# Altium schematic symbol library jlcpcb_2025_04_capacitors_extended_0402.schlib: 3594 symbols (part 8 of 20) (continued)
## CC0402JRNPO9BN360
designator C?  Capacitance: 36pF  (hidden comment: *)
Capacitor, Ceramic (MLCC), 36pF, ±5%, 50V, NP0, ±5%, SMD 0402; Manufacturer: YAGEO; Manufacturer Part Number: CC0402JRNPO9BN360; Package Size: 0402; JLCPCB Basic Part: No; JLCPCB Part Number: C114394; Supplier 1: LCSC; Category: Capacitors - MLCC; Supplier Part Number 1: C114394; Tolerance: ±5%; Voltage Rating: 50V; Temperature Coefficient: NP0; RoHS: Yes; ComponentLink1Description: Datasheet; ComponentLink1URL: https://wmsc.lcsc.com/wmsc/upload/file/pdf/v2/lcsc/2304140030_YAGEO-CC0402JRNPO9BN360_C114394.pdf; ComponentLink2Description: JLCPCB Part URL; ComponentLink2URL: https://jlcpcb.com/partdetail/C114394; ComponentLink3Description: LCSC Part URL; ComponentLink3URL: https://lcsc.com/product-detail/Multilayer-Ceramic-Capacitors-MLCC---SMD-SMT_YAGEO-YAGEO-CC0402JRNPO9BN360_C114394.html
footprint CAP-0402 (0402 (1005M) Capacitor)
pins: 1, 2

## CC0402JRNPO9BN390
designator C?  Capacitance: 39pF  (hidden comment: *)
Capacitor, Ceramic (MLCC), 39pF, ±5%, 50V, NP0, ±5%, SMD 0402; Manufacturer: YAGEO; Manufacturer Part Number: CC0402JRNPO9BN390; Package Size: 0402; JLCPCB Basic Part: No; JLCPCB Part Number: C106223; Supplier 1: LCSC; Category: Capacitors - MLCC; Supplier Part Number 1: C106223; Tolerance: ±5%; Voltage Rating: 50V; Temperature Coefficient: NP0; RoHS: Yes; ComponentLink1Description: Datasheet; ComponentLink1URL: https://wmsc.lcsc.com/wmsc/upload/file/pdf/v2/lcsc/2304140030_YAGEO-CC0402JRNPO9BN390_C106223.pdf; ComponentLink2Description: JLCPCB Part URL; ComponentLink2URL: https://jlcpcb.com/partdetail/C106223; ComponentLink3Description: LCSC Part URL; ComponentLink3URL: https://lcsc.com/product-detail/Multilayer-Ceramic-Capacitors-MLCC---SMD-SMT_YAGEO-YAGEO-CC0402JRNPO9BN390_C106223.html
footprint CAP-0402 (0402 (1005M) Capacitor)
pins: 1, 2

## CC0402JRNPO9BN391
designator C?  Capacitance: 390pF  (hidden comment: *)
Capacitor, Ceramic (MLCC), 390pF, ±5%, 50V, NP0, ±5%, SMD 0402; Manufacturer: YAGEO; Manufacturer Part Number: CC0402JRNPO9BN391; Package Size: 0402; JLCPCB Basic Part: No; JLCPCB Part Number: C282239; Supplier 1: LCSC; Category: Capacitors - MLCC; Supplier Part Number 1: C282239; Tolerance: ±5%; Voltage Rating: 50V; Temperature Coefficient: NP0; RoHS: Yes; ComponentLink1Description: Datasheet; ComponentLink1URL: https://wmsc.lcsc.com/wmsc/upload/file/pdf/v2/lcsc/2304140030_YAGEO-CC0402JRNPO9BN391_C282239.pdf; ComponentLink2Description: JLCPCB Part URL; ComponentLink2URL: https://jlcpcb.com/partdetail/C282239; ComponentLink3Description: LCSC Part URL; ComponentLink3URL: https://lcsc.com/product-detail/Multilayer-Ceramic-Capacitors-MLCC---SMD-SMT_YAGEO-YAGEO-CC0402JRNPO9BN391_C282239.html
footprint CAP-0402 (0402 (1005M) Capacitor)
pins: 1, 2

## CC0402JRNPO9BN430
designator C?  Capacitance: 43pF  (hidden comment: *)
Capacitor, Ceramic (MLCC), 43pF, ±5%, 50V, NP0, ±5%, SMD 0402; Manufacturer: YAGEO; Manufacturer Part Number: CC0402JRNPO9BN430; Package Size: 0402; JLCPCB Basic Part: No; JLCPCB Part Number: C541364; Supplier 1: LCSC; Category: Capacitors - MLCC; Supplier Part Number 1: C541364; Tolerance: ±5%; Voltage Rating: 50V; Temperature Coefficient: NP0; RoHS: Yes; ComponentLink1Description: Datasheet; ComponentLink1URL: https://wmsc.lcsc.com/wmsc/upload/file/pdf/v2/lcsc/2006151112_YAGEO-CC0402JRNPO9BN430_C541364.pdf; ComponentLink2Description: JLCPCB Part URL; ComponentLink2URL: https://jlcpcb.com/partdetail/C541364; ComponentLink3Description: LCSC Part URL; ComponentLink3URL: https://lcsc.com/product-detail/Multilayer-Ceramic-Capacitors-MLCC---SMD-SMT_YAGEO-YAGEO-CC0402JRNPO9BN430_C541364.html
footprint CAP-0402 (0402 (1005M) Capacitor)
pins: 1, 2

## CC0402JRNPO9BN470
designator C?  Capacitance: 47pF  (hidden comment: *)
Capacitor, Ceramic (MLCC), 47pF, ±5%, 50V, NP0, ±5%, SMD 0402; Manufacturer: YAGEO; Manufacturer Part Number: CC0402JRNPO9BN470; Package Size: 0402; JLCPCB Basic Part: No; JLCPCB Part Number: C60137; Supplier 1: LCSC; Category: Capacitors - MLCC; Supplier Part Number 1: C60137; Tolerance: ±5%; Voltage Rating: 50V; Temperature Coefficient: NP0; RoHS: Yes; ComponentLink1Description: Datasheet; ComponentLink1URL: https://wmsc.lcsc.com/wmsc/upload/file/pdf/v2/lcsc/2304140030_YAGEO-CC0402JRNPO9BN470_C60137.pdf; ComponentLink2Description: JLCPCB Part URL; ComponentLink2URL: https://jlcpcb.com/partdetail/C60137; ComponentLink3Description: LCSC Part URL; ComponentLink3URL: https://lcsc.com/product-detail/Multilayer-Ceramic-Capacitors-MLCC---SMD-SMT_YAGEO-YAGEO-CC0402JRNPO9BN470_C60137.html
footprint CAP-0402 (0402 (1005M) Capacitor)
pins: 1, 2

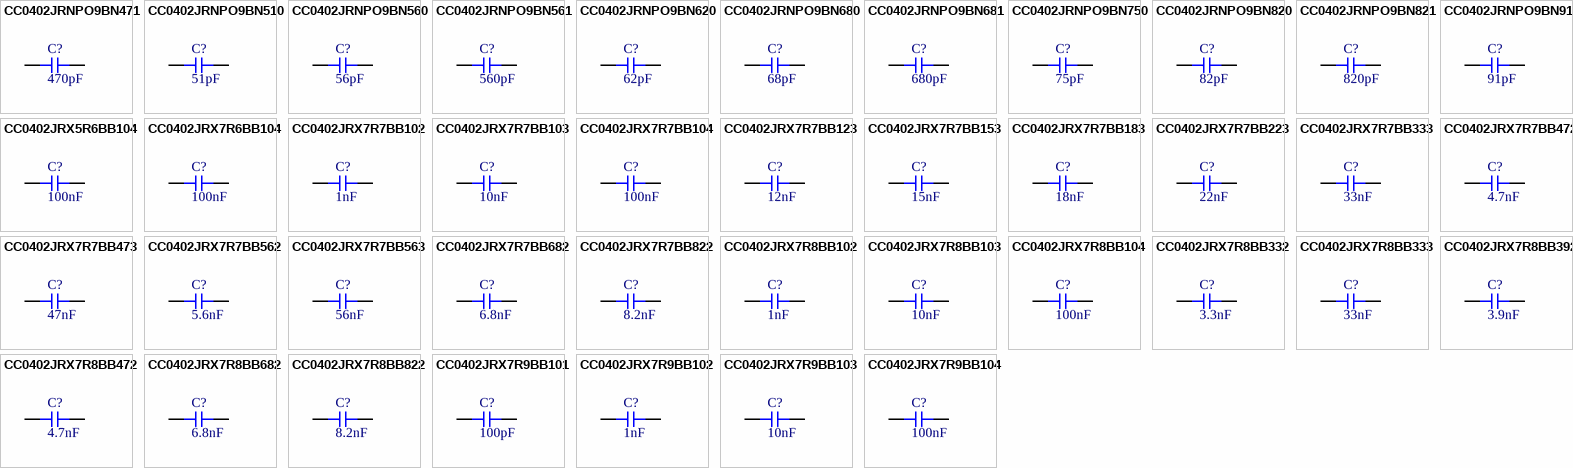
[diagram p35: symbols CC0402JRNPO9BN471 to CC0402JRX7R9BB104]

## CC0402JRNPO9BN471
designator C?  Capacitance: 470pF  (hidden comment: *)
Capacitor, Ceramic (MLCC), 470pF, ±5%, 50V, NP0, ±5%, SMD 0402; Manufacturer: YAGEO; Manufacturer Part Number: CC0402JRNPO9BN471; Package Size: 0402; JLCPCB Basic Part: No; JLCPCB Part Number: C106259; Supplier 1: LCSC; Category: Capacitors - MLCC; Supplier Part Number 1: C106259; Tolerance: ±5%; Voltage Rating: 50V; Temperature Coefficient: NP0; RoHS: Yes; ComponentLink1Description: Datasheet; ComponentLink1URL: https://wmsc.lcsc.com/wmsc/upload/file/pdf/v2/lcsc/2304140030_YAGEO-CC0402JRNPO9BN471_C106259.pdf; ComponentLink2Description: JLCPCB Part URL; ComponentLink2URL: https://jlcpcb.com/partdetail/C106259; ComponentLink3Description: LCSC Part URL; ComponentLink3URL: https://lcsc.com/product-detail/Multilayer-Ceramic-Capacitors-MLCC---SMD-SMT_YAGEO-YAGEO-CC0402JRNPO9BN471_C106259.html
footprint CAP-0402 (0402 (1005M) Capacitor)
pins: 1, 2

## CC0402JRNPO9BN510
designator C?  Capacitance: 51pF  (hidden comment: *)
Capacitor, Ceramic (MLCC), 51pF, ±5%, 50V, NP0, ±5%, SMD 0402; Manufacturer: YAGEO; Manufacturer Part Number: CC0402JRNPO9BN510; Package Size: 0402; JLCPCB Basic Part: No; JLCPCB Part Number: C281759; Supplier 1: LCSC; Category: Capacitors - MLCC; Supplier Part Number 1: C281759; Tolerance: ±5%; Voltage Rating: 50V; Temperature Coefficient: NP0; RoHS: Yes; ComponentLink1Description: Datasheet; ComponentLink1URL: https://wmsc.lcsc.com/wmsc/upload/file/pdf/v2/lcsc/1811070918_YAGEO-CC0402JRNPO9BN510_C281759.pdf; ComponentLink2Description: JLCPCB Part URL; ComponentLink2URL: https://jlcpcb.com/partdetail/C281759; ComponentLink3Description: LCSC Part URL; ComponentLink3URL: https://lcsc.com/product-detail/Multilayer-Ceramic-Capacitors-MLCC---SMD-SMT_YAGEO-YAGEO-CC0402JRNPO9BN510_C281759.html
footprint CAP-0402 (0402 (1005M) Capacitor)
pins: 1, 2

## CC0402JRNPO9BN560
designator C?  Capacitance: 56pF  (hidden comment: *)
Capacitor, Ceramic (MLCC), 56pF, ±5%, 50V, NP0, ±5%, SMD 0402; Manufacturer: YAGEO; Manufacturer Part Number: CC0402JRNPO9BN560; Package Size: 0402; JLCPCB Basic Part: No; JLCPCB Part Number: C107007; Supplier 1: LCSC; Category: Capacitors - MLCC; Supplier Part Number 1: C107007; Tolerance: ±5%; Voltage Rating: 50V; Temperature Coefficient: NP0; RoHS: Yes; ComponentLink1Description: Datasheet; ComponentLink1URL: https://wmsc.lcsc.com/wmsc/upload/file/pdf/v2/lcsc/2304140030_YAGEO-CC0402JRNPO9BN560_C107007.pdf; ComponentLink2Description: JLCPCB Part URL; ComponentLink2URL: https://jlcpcb.com/partdetail/C107007; ComponentLink3Description: LCSC Part URL; ComponentLink3URL: https://lcsc.com/product-detail/Multilayer-Ceramic-Capacitors-MLCC---SMD-SMT_YAGEO-YAGEO-CC0402JRNPO9BN560_C107007.html
footprint CAP-0402 (0402 (1005M) Capacitor)
pins: 1, 2

## CC0402JRNPO9BN561
designator C?  Capacitance: 560pF  (hidden comment: *)
Capacitor, Ceramic (MLCC), 560pF, ±5%, 50V, NP0, ±5%, SMD 0402; Manufacturer: YAGEO; Manufacturer Part Number: CC0402JRNPO9BN561; Package Size: 0402; JLCPCB Basic Part: No; JLCPCB Part Number: C107008; Supplier 1: LCSC; Category: Capacitors - MLCC; Supplier Part Number 1: C107008; Tolerance: ±5%; Voltage Rating: 50V; Temperature Coefficient: NP0; RoHS: Yes; ComponentLink1Description: Datasheet; ComponentLink1URL: https://wmsc.lcsc.com/wmsc/upload/file/pdf/v2/lcsc/2304140030_YAGEO-CC0402JRNPO9BN561_C107008.pdf; ComponentLink2Description: JLCPCB Part URL; ComponentLink2URL: https://jlcpcb.com/partdetail/C107008; ComponentLink3Description: LCSC Part URL; ComponentLink3URL: https://lcsc.com/product-detail/Multilayer-Ceramic-Capacitors-MLCC---SMD-SMT_YAGEO-YAGEO-CC0402JRNPO9BN561_C107008.html
footprint CAP-0402 (0402 (1005M) Capacitor)
pins: 1, 2

## CC0402JRNPO9BN620
designator C?  Capacitance: 62pF  (hidden comment: *)
Capacitor, Ceramic (MLCC), 62pF, ±5%, 50V, NP0, ±5%, SMD 0402; Manufacturer: YAGEO; Manufacturer Part Number: CC0402JRNPO9BN620; Package Size: 0402; JLCPCB Basic Part: No; JLCPCB Part Number: C281763; Supplier 1: LCSC; Category: Capacitors - MLCC; Supplier Part Number 1: C281763; Tolerance: ±5%; Voltage Rating: 50V; Temperature Coefficient: NP0; RoHS: Yes; ComponentLink1Description: Datasheet; ComponentLink1URL: https://wmsc.lcsc.com/wmsc/upload/file/pdf/v2/lcsc/2304140030_YAGEO-CC0402JRNPO9BN620_C281763.pdf; ComponentLink2Description: JLCPCB Part URL; ComponentLink2URL: https://jlcpcb.com/partdetail/C281763; ComponentLink3Description: LCSC Part URL; ComponentLink3URL: https://lcsc.com/product-detail/Multilayer-Ceramic-Capacitors-MLCC---SMD-SMT_YAGEO-YAGEO-CC0402JRNPO9BN620_C281763.html
footprint CAP-0402 (0402 (1005M) Capacitor)
pins: 1, 2

## CC0402JRNPO9BN680
designator C?  Capacitance: 68pF  (hidden comment: *)
Capacitor, Ceramic (MLCC), 68pF, ±5%, 50V, NP0, ±5%, SMD 0402; Manufacturer: YAGEO; Manufacturer Part Number: CC0402JRNPO9BN680; Package Size: 0402; JLCPCB Basic Part: No; JLCPCB Part Number: C107009; Supplier 1: LCSC; Category: Capacitors - MLCC; Supplier Part Number 1: C107009; Tolerance: ±5%; Voltage Rating: 50V; Temperature Coefficient: NP0; RoHS: Yes; ComponentLink1Description: Datasheet; ComponentLink1URL: https://wmsc.lcsc.com/wmsc/upload/file/pdf/v2/lcsc/2304140030_YAGEO-CC0402JRNPO9BN680_C107009.pdf; ComponentLink2Description: JLCPCB Part URL; ComponentLink2URL: https://jlcpcb.com/partdetail/C107009; ComponentLink3Description: LCSC Part URL; ComponentLink3URL: https://lcsc.com/product-detail/Multilayer-Ceramic-Capacitors-MLCC---SMD-SMT_YAGEO-YAGEO-CC0402JRNPO9BN680_C107009.html
footprint CAP-0402 (0402 (1005M) Capacitor)
pins: 1, 2

## CC0402JRNPO9BN681
designator C?  Capacitance: 680pF  (hidden comment: *)
Capacitor, Ceramic (MLCC), 680pF, ±5%, 50V, NP0, ±5%, SMD 0402; Manufacturer: YAGEO; Manufacturer Part Number: CC0402JRNPO9BN681; Package Size: 0402; JLCPCB Basic Part: No; JLCPCB Part Number: C113781; Supplier 1: LCSC; Category: Capacitors - MLCC; Supplier Part Number 1: C113781; Tolerance: ±5%; Voltage Rating: 50V; Temperature Coefficient: NP0; RoHS: Yes; ComponentLink1Description: Datasheet; ComponentLink1URL: https://wmsc.lcsc.com/wmsc/upload/file/pdf/v2/lcsc/2304140030_YAGEO-CC0402JRNPO9BN681_C113781.pdf; ComponentLink2Description: JLCPCB Part URL; ComponentLink2URL: https://jlcpcb.com/partdetail/C113781; ComponentLink3Description: LCSC Part URL; ComponentLink3URL: https://lcsc.com/product-detail/Multilayer-Ceramic-Capacitors-MLCC---SMD-SMT_YAGEO-YAGEO-CC0402JRNPO9BN681_C113781.html
footprint CAP-0402 (0402 (1005M) Capacitor)
pins: 1, 2

## CC0402JRNPO9BN750
designator C?  Capacitance: 75pF  (hidden comment: *)
Capacitor, Ceramic (MLCC), 75pF, ±5%, 50V, NP0, ±5%, SMD 0402; Manufacturer: YAGEO; Manufacturer Part Number: CC0402JRNPO9BN750; Package Size: 0402; JLCPCB Basic Part: No; JLCPCB Part Number: C107010; Supplier 1: LCSC; Category: Capacitors - MLCC; Supplier Part Number 1: C107010; Tolerance: ±5%; Voltage Rating: 50V; Temperature Coefficient: NP0; RoHS: Yes; ComponentLink1Description: Datasheet; ComponentLink1URL: https://wmsc.lcsc.com/wmsc/upload/file/pdf/v2/lcsc/2304140030_YAGEO-CC0402JRNPO9BN750_C107010.pdf; ComponentLink2Description: JLCPCB Part URL; ComponentLink2URL: https://jlcpcb.com/partdetail/C107010; ComponentLink3Description: LCSC Part URL; ComponentLink3URL: https://lcsc.com/product-detail/Multilayer-Ceramic-Capacitors-MLCC---SMD-SMT_YAGEO-YAGEO-CC0402JRNPO9BN750_C107010.html
footprint CAP-0402 (0402 (1005M) Capacitor)
pins: 1, 2

## CC0402JRNPO9BN820
designator C?  Capacitance: 82pF  (hidden comment: *)
Capacitor, Ceramic (MLCC), 82pF, ±5%, 50V, NP0, ±5%, SMD 0402; Manufacturer: YAGEO; Manufacturer Part Number: CC0402JRNPO9BN820; Package Size: 0402; JLCPCB Basic Part: No; JLCPCB Part Number: C107011; Supplier 1: LCSC; Category: Capacitors - MLCC; Supplier Part Number 1: C107011; Tolerance: ±5%; Voltage Rating: 50V; Temperature Coefficient: NP0; RoHS: Yes; ComponentLink1Description: Datasheet; ComponentLink1URL: https://wmsc.lcsc.com/wmsc/upload/file/pdf/v2/lcsc/2304140030_YAGEO-CC0402JRNPO9BN820_C107011.pdf; ComponentLink2Description: JLCPCB Part URL; ComponentLink2URL: https://jlcpcb.com/partdetail/C107011; ComponentLink3Description: LCSC Part URL; ComponentLink3URL: https://lcsc.com/product-detail/Multilayer-Ceramic-Capacitors-MLCC---SMD-SMT_YAGEO-YAGEO-CC0402JRNPO9BN820_C107011.html
footprint CAP-0402 (0402 (1005M) Capacitor)
pins: 1, 2

## CC0402JRNPO9BN821
designator C?  Capacitance: 820pF  (hidden comment: *)
Capacitor, Ceramic (MLCC), 820pF, ±5%, 50V, NP0, ±5%, SMD 0402; Manufacturer: YAGEO; Manufacturer Part Number: CC0402JRNPO9BN821; Package Size: 0402; JLCPCB Basic Part: No; JLCPCB Part Number: C726612; Supplier 1: LCSC; Category: Capacitors - MLCC; Supplier Part Number 1: C726612; Tolerance: ±5%; Voltage Rating: 50V; Temperature Coefficient: NP0; RoHS: Yes; ComponentLink1Description: Datasheet; ComponentLink1URL: https://wmsc.lcsc.com/wmsc/upload/file/pdf/v2/lcsc/2304140030_YAGEO-CC0402JRNPO9BN821_C726612.pdf; ComponentLink2Description: JLCPCB Part URL; ComponentLink2URL: https://jlcpcb.com/partdetail/C726612; ComponentLink3Description: LCSC Part URL; ComponentLink3URL: https://lcsc.com/product-detail/Multilayer-Ceramic-Capacitors-MLCC---SMD-SMT_YAGEO-YAGEO-CC0402JRNPO9BN821_C726612.html
footprint CAP-0402 (0402 (1005M) Capacitor)
pins: 1, 2

## CC0402JRNPO9BN910
designator C?  Capacitance: 91pF  (hidden comment: *)
Capacitor, Ceramic (MLCC), 91pF, ±5%, 50V, NP0, ±5%, SMD 0402; Manufacturer: YAGEO; Manufacturer Part Number: CC0402JRNPO9BN910; Package Size: 0402; JLCPCB Basic Part: No; JLCPCB Part Number: C541365; Supplier 1: LCSC; Category: Capacitors - MLCC; Supplier Part Number 1: C541365; Tolerance: ±5%; Voltage Rating: 50V; Temperature Coefficient: NP0; RoHS: Yes; ComponentLink1Description: Datasheet; ComponentLink1URL: https://wmsc.lcsc.com/wmsc/upload/file/pdf/v2/lcsc/2006151112_YAGEO-CC0402JRNPO9BN910_C541365.pdf; ComponentLink2Description: JLCPCB Part URL; ComponentLink2URL: https://jlcpcb.com/partdetail/C541365; ComponentLink3Description: LCSC Part URL; ComponentLink3URL: https://lcsc.com/product-detail/Multilayer-Ceramic-Capacitors-MLCC---SMD-SMT_YAGEO-YAGEO-CC0402JRNPO9BN910_C541365.html
footprint CAP-0402 (0402 (1005M) Capacitor)
pins: 1, 2

## CC0402JRX5R6BB104
designator C?  Capacitance: 100nF  (hidden comment: *)
Capacitor, Ceramic (MLCC), 100nF, ±5%, 10V, X5R, ±5%, SMD 0402; Manufacturer: YAGEO; Manufacturer Part Number: CC0402JRX5R6BB104; Package Size: 0402; JLCPCB Basic Part: No; JLCPCB Part Number: C2185597; Supplier 1: LCSC; Category: Capacitors - MLCC; Supplier Part Number 1: C2185597; Tolerance: ±5%; Voltage Rating: 10V; Temperature Coefficient: X5R; RoHS: Yes; ComponentLink1Description: Datasheet; ComponentLink1URL: https://wmsc.lcsc.com/wmsc/upload/file/pdf/v2/lcsc/2407081117_YAGEO-CC0402JRX5R6BB104_C2185597.pdf; ComponentLink2Description: JLCPCB Part URL; ComponentLink2URL: https://jlcpcb.com/partdetail/C2185597; ComponentLink3Description: LCSC Part URL; ComponentLink3URL: https://lcsc.com/product-detail/Multilayer-Ceramic-Capacitors-MLCC---SMD-SMT_YAGEO-YAGEO-CC0402JRX5R6BB104_C2185597.html
footprint CAP-0402 (0402 (1005M) Capacitor)
pins: 1, 2

## CC0402JRX7R6BB104
designator C?  Capacitance: 100nF  (hidden comment: *)
Capacitor, Ceramic (MLCC), 100nF, ±5%, 10V, X7R, ±5%, SMD 0402; Manufacturer: YAGEO; Manufacturer Part Number: CC0402JRX7R6BB104; Package Size: 0402; JLCPCB Basic Part: No; JLCPCB Part Number: C527001; Supplier 1: LCSC; Category: Capacitors - MLCC; Supplier Part Number 1: C527001; Tolerance: ±5%; Voltage Rating: 10V; Temperature Coefficient: X7R; RoHS: Yes; ComponentLink1Description: Datasheet; ComponentLink1URL: https://wmsc.lcsc.com/wmsc/upload/file/pdf/v2/lcsc/2006101834_YAGEO-CC0402JRX7R6BB104_C527001.pdf; ComponentLink2Description: JLCPCB Part URL; ComponentLink2URL: https://jlcpcb.com/partdetail/C527001; ComponentLink3Description: LCSC Part URL; ComponentLink3URL: https://lcsc.com/product-detail/Multilayer-Ceramic-Capacitors-MLCC---SMD-SMT_YAGEO-YAGEO-CC0402JRX7R6BB104_C527001.html
footprint CAP-0402 (0402 (1005M) Capacitor)
pins: 1, 2

## CC0402JRX7R7BB102
designator C?  Capacitance: 1nF  (hidden comment: *)
Capacitor, Ceramic (MLCC), 1nF, ±5%, 16V, X7R, ±5%, SMD 0402; Manufacturer: YAGEO; Manufacturer Part Number: CC0402JRX7R7BB102; Package Size: 0402; JLCPCB Basic Part: No; JLCPCB Part Number: C541441; Supplier 1: LCSC; Category: Capacitors - MLCC; Supplier Part Number 1: C541441; Tolerance: ±5%; Voltage Rating: 16V; Temperature Coefficient: X7R; RoHS: Yes; ComponentLink1Description: Datasheet; ComponentLink1URL: https://wmsc.lcsc.com/wmsc/upload/file/pdf/v2/lcsc/2006151136_YAGEO-CC0402JRX7R7BB102_C541441.pdf; ComponentLink2Description: JLCPCB Part URL; ComponentLink2URL: https://jlcpcb.com/partdetail/C541441; ComponentLink3Description: LCSC Part URL; ComponentLink3URL: https://lcsc.com/product-detail/Multilayer-Ceramic-Capacitors-MLCC---SMD-SMT_YAGEO-YAGEO-CC0402JRX7R7BB102_C541441.html
footprint CAP-0402 (0402 (1005M) Capacitor)
pins: 1, 2

## CC0402JRX7R7BB103
designator C?  Capacitance: 10nF  (hidden comment: *)
Capacitor, Ceramic (MLCC), 10nF, ±5%, 16V, X7R, ±5%, SMD 0402; Manufacturer: YAGEO; Manufacturer Part Number: CC0402JRX7R7BB103; Package Size: 0402; JLCPCB Basic Part: No; JLCPCB Part Number: C354974; Supplier 1: LCSC; Category: Capacitors - MLCC; Supplier Part Number 1: C354974; Tolerance: ±5%; Voltage Rating: 16V; Temperature Coefficient: X7R; RoHS: Yes; ComponentLink1Description: Datasheet; ComponentLink1URL: https://wmsc.lcsc.com/wmsc/upload/file/pdf/v2/lcsc/2311211121_YAGEO-CC0402JRX7R7BB103_C354974.pdf; ComponentLink2Description: JLCPCB Part URL; ComponentLink2URL: https://jlcpcb.com/partdetail/C354974; ComponentLink3Description: LCSC Part URL; ComponentLink3URL: https://lcsc.com/product-detail/Multilayer-Ceramic-Capacitors-MLCC---SMD-SMT_YAGEO-YAGEO-CC0402JRX7R7BB103_C354974.html
footprint CAP-0402 (0402 (1005M) Capacitor)
pins: 1, 2

## CC0402JRX7R7BB104
designator C?  Capacitance: 100nF  (hidden comment: *)
Capacitor, Ceramic (MLCC), 100nF, ±5%, 16V, X7R, ±5%, SMD 0402; Manufacturer: YAGEO; Manufacturer Part Number: CC0402JRX7R7BB104; Package Size: 0402; JLCPCB Basic Part: No; JLCPCB Part Number: C541464; Supplier 1: LCSC; Category: Capacitors - MLCC; Supplier Part Number 1: C541464; Tolerance: ±5%; Voltage Rating: 16V; Temperature Coefficient: X7R; RoHS: Yes; ComponentLink1Description: Datasheet; ComponentLink1URL: https://wmsc.lcsc.com/wmsc/upload/file/pdf/v2/lcsc/2006151138_YAGEO-CC0402JRX7R7BB104_C541464.pdf; ComponentLink2Description: JLCPCB Part URL; ComponentLink2URL: https://jlcpcb.com/partdetail/C541464; ComponentLink3Description: LCSC Part URL; ComponentLink3URL: https://lcsc.com/product-detail/Multilayer-Ceramic-Capacitors-MLCC---SMD-SMT_YAGEO-YAGEO-CC0402JRX7R7BB104_C541464.html
footprint CAP-0402 (0402 (1005M) Capacitor)
pins: 1, 2

## CC0402JRX7R7BB123
designator C?  Capacitance: 12nF  (hidden comment: *)
Capacitor, Ceramic (MLCC), 12nF, ±5%, 16V, X7R, ±5%, SMD 0402; Manufacturer: YAGEO; Manufacturer Part Number: CC0402JRX7R7BB123; Package Size: 0402; JLCPCB Basic Part: No; JLCPCB Part Number: C576708; Supplier 1: LCSC; Category: Capacitors - MLCC; Supplier Part Number 1: C576708; Tolerance: ±5%; Voltage Rating: 16V; Temperature Coefficient: X7R; RoHS: Yes; ComponentLink1Description: Datasheet; ComponentLink1URL: https://wmsc.lcsc.com/wmsc/upload/file/pdf/v2/lcsc/2205071500_YAGEO-CC0402JRX7R7BB123_C576708.pdf; ComponentLink2Description: JLCPCB Part URL; ComponentLink2URL: https://jlcpcb.com/partdetail/C576708; ComponentLink3Description: LCSC Part URL; ComponentLink3URL: https://lcsc.com/product-detail/Multilayer-Ceramic-Capacitors-MLCC---SMD-SMT_YAGEO-YAGEO-CC0402JRX7R7BB123_C576708.html
footprint CAP-0402 (0402 (1005M) Capacitor)
pins: 1, 2

## CC0402JRX7R7BB153
designator C?  Capacitance: 15nF  (hidden comment: *)
Capacitor, Ceramic (MLCC), 15nF, ±5%, 16V, X7R, ±5%, SMD 0402; Manufacturer: YAGEO; Manufacturer Part Number: CC0402JRX7R7BB153; Package Size: 0402; JLCPCB Basic Part: No; JLCPCB Part Number: C527002; Supplier 1: LCSC; Category: Capacitors - MLCC; Supplier Part Number 1: C527002; Tolerance: ±5%; Voltage Rating: 16V; Temperature Coefficient: X7R; RoHS: Yes; ComponentLink1Description: Datasheet; ComponentLink1URL: https://wmsc.lcsc.com/wmsc/upload/file/pdf/v2/lcsc/2005261832_YAGEO-CC0402JRX7R7BB153_C527002.pdf; ComponentLink2Description: JLCPCB Part URL; ComponentLink2URL: https://jlcpcb.com/partdetail/C527002; ComponentLink3Description: LCSC Part URL; ComponentLink3URL: https://lcsc.com/product-detail/Multilayer-Ceramic-Capacitors-MLCC---SMD-SMT_YAGEO-YAGEO-CC0402JRX7R7BB153_C527002.html
footprint CAP-0402 (0402 (1005M) Capacitor)
pins: 1, 2

## CC0402JRX7R7BB183
designator C?  Capacitance: 18nF  (hidden comment: *)
Capacitor, Ceramic (MLCC), 18nF, ±5%, 16V, X7R, ±5%, SMD 0402; Manufacturer: YAGEO; Manufacturer Part Number: CC0402JRX7R7BB183; Package Size: 0402; JLCPCB Basic Part: No; JLCPCB Part Number: C576709; Supplier 1: LCSC; Category: Capacitors - MLCC; Supplier Part Number 1: C576709; Tolerance: ±5%; Voltage Rating: 16V; Temperature Coefficient: X7R; RoHS: Yes; ComponentLink1Description: Datasheet; ComponentLink1URL: https://wmsc.lcsc.com/wmsc/upload/file/pdf/v2/lcsc/2205191730_YAGEO-CC0402JRX7R7BB183_C576709.pdf; ComponentLink2Description: JLCPCB Part URL; ComponentLink2URL: https://jlcpcb.com/partdetail/C576709; ComponentLink3Description: LCSC Part URL; ComponentLink3URL: https://lcsc.com/product-detail/Multilayer-Ceramic-Capacitors-MLCC---SMD-SMT_YAGEO-YAGEO-CC0402JRX7R7BB183_C576709.html
footprint CAP-0402 (0402 (1005M) Capacitor)
pins: 1, 2

## CC0402JRX7R7BB223
designator C?  Capacitance: 22nF  (hidden comment: *)
Capacitor, Ceramic (MLCC), 22nF, ±5%, 16V, X7R, ±5%, SMD 0402; Manufacturer: YAGEO; Manufacturer Part Number: CC0402JRX7R7BB223; Package Size: 0402; JLCPCB Basic Part: No; JLCPCB Part Number: C541459; Supplier 1: LCSC; Category: Capacitors - MLCC; Supplier Part Number 1: C541459; Tolerance: ±5%; Voltage Rating: 16V; Temperature Coefficient: X7R; RoHS: Yes; ComponentLink1Description: Datasheet; ComponentLink1URL: https://wmsc.lcsc.com/wmsc/upload/file/pdf/v2/lcsc/2006151138_YAGEO-CC0402JRX7R7BB223_C541459.pdf; ComponentLink2Description: JLCPCB Part URL; ComponentLink2URL: https://jlcpcb.com/partdetail/C541459; ComponentLink3Description: LCSC Part URL; ComponentLink3URL: https://lcsc.com/product-detail/Multilayer-Ceramic-Capacitors-MLCC---SMD-SMT_YAGEO-YAGEO-CC0402JRX7R7BB223_C541459.html
footprint CAP-0402 (0402 (1005M) Capacitor)
pins: 1, 2

## CC0402JRX7R7BB333
designator C?  Capacitance: 33nF  (hidden comment: *)
Capacitor, Ceramic (MLCC), 33nF, ±5%, 16V, X7R, ±5%, SMD 0402; Manufacturer: YAGEO; Manufacturer Part Number: CC0402JRX7R7BB333; Package Size: 0402; JLCPCB Basic Part: No; JLCPCB Part Number: C541461; Supplier 1: LCSC; Category: Capacitors - MLCC; Supplier Part Number 1: C541461; Tolerance: ±5%; Voltage Rating: 16V; Temperature Coefficient: X7R; RoHS: Yes; ComponentLink1Description: Datasheet; ComponentLink1URL: https://wmsc.lcsc.com/wmsc/upload/file/pdf/v2/lcsc/2006151138_YAGEO-CC0402JRX7R7BB333_C541461.pdf; ComponentLink2Description: JLCPCB Part URL; ComponentLink2URL: https://jlcpcb.com/partdetail/C541461; ComponentLink3Description: LCSC Part URL; ComponentLink3URL: https://lcsc.com/product-detail/Multilayer-Ceramic-Capacitors-MLCC---SMD-SMT_YAGEO-YAGEO-CC0402JRX7R7BB333_C541461.html
footprint CAP-0402 (0402 (1005M) Capacitor)
pins: 1, 2

## CC0402JRX7R7BB472
designator C?  Capacitance: 4.7nF  (hidden comment: *)
Capacitor, Ceramic (MLCC), 4.7nF, ±5%, 16V, X7R, ±5%, SMD 0402; Manufacturer: YAGEO; Manufacturer Part Number: CC0402JRX7R7BB472; Package Size: 0402; JLCPCB Basic Part: No; JLCPCB Part Number: C541444; Supplier 1: LCSC; Category: Capacitors - MLCC; Supplier Part Number 1: C541444; Tolerance: ±5%; Voltage Rating: 16V; Temperature Coefficient: X7R; RoHS: Yes; ComponentLink1Description: Datasheet; ComponentLink1URL: https://wmsc.lcsc.com/wmsc/upload/file/pdf/v2/lcsc/2006151136_YAGEO-CC0402JRX7R7BB472_C541444.pdf; ComponentLink2Description: JLCPCB Part URL; ComponentLink2URL: https://jlcpcb.com/partdetail/C541444; ComponentLink3Description: LCSC Part URL; ComponentLink3URL: https://lcsc.com/product-detail/Multilayer-Ceramic-Capacitors-MLCC---SMD-SMT_YAGEO-YAGEO-CC0402JRX7R7BB472_C541444.html
footprint CAP-0402 (0402 (1005M) Capacitor)
pins: 1, 2

## CC0402JRX7R7BB473
designator C?  Capacitance: 47nF  (hidden comment: *)
Capacitor, Ceramic (MLCC), 47nF, ±5%, 16V, X7R, ±5%, SMD 0402; Manufacturer: YAGEO; Manufacturer Part Number: CC0402JRX7R7BB473; Package Size: 0402; JLCPCB Basic Part: No; JLCPCB Part Number: C576710; Supplier 1: LCSC; Category: Capacitors - MLCC; Supplier Part Number 1: C576710; Tolerance: ±5%; Voltage Rating: 16V; Temperature Coefficient: X7R; RoHS: Yes; ComponentLink1Description: Datasheet; ComponentLink1URL: https://wmsc.lcsc.com/wmsc/upload/file/pdf/v2/lcsc/2112231430_YAGEO-CC0402JRX7R7BB473_C576710.pdf; ComponentLink2Description: JLCPCB Part URL; ComponentLink2URL: https://jlcpcb.com/partdetail/C576710; ComponentLink3Description: LCSC Part URL; ComponentLink3URL: https://lcsc.com/product-detail/Multilayer-Ceramic-Capacitors-MLCC---SMD-SMT_YAGEO-YAGEO-CC0402JRX7R7BB473_C576710.html
footprint CAP-0402 (0402 (1005M) Capacitor)
pins: 1, 2

## CC0402JRX7R7BB562
designator C?  Capacitance: 5.6nF  (hidden comment: *)
Capacitor, Ceramic (MLCC), 5.6nF, ±5%, 16V, X7R, ±5%, SMD 0402; Manufacturer: YAGEO; Manufacturer Part Number: CC0402JRX7R7BB562; Package Size: 0402; JLCPCB Basic Part: No; JLCPCB Part Number: C541448; Supplier 1: LCSC; Category: Capacitors - MLCC; Supplier Part Number 1: C541448; Tolerance: ±5%; Voltage Rating: 16V; Temperature Coefficient: X7R; RoHS: Yes; ComponentLink1Description: Datasheet; ComponentLink1URL: https://wmsc.lcsc.com/wmsc/upload/file/pdf/v2/lcsc/2006151136_YAGEO-CC0402JRX7R7BB562_C541448.pdf; ComponentLink2Description: JLCPCB Part URL; ComponentLink2URL: https://jlcpcb.com/partdetail/C541448; ComponentLink3Description: LCSC Part URL; ComponentLink3URL: https://lcsc.com/product-detail/Multilayer-Ceramic-Capacitors-MLCC---SMD-SMT_YAGEO-YAGEO-CC0402JRX7R7BB562_C541448.html
footprint CAP-0402 (0402 (1005M) Capacitor)
pins: 1, 2

## CC0402JRX7R7BB563
designator C?  Capacitance: 56nF  (hidden comment: *)
Capacitor, Ceramic (MLCC), 56nF, ±5%, 16V, X7R, ±5%, SMD 0402; Manufacturer: YAGEO; Manufacturer Part Number: CC0402JRX7R7BB563; Package Size: 0402; JLCPCB Basic Part: No; JLCPCB Part Number: C576711; Supplier 1: LCSC; Category: Capacitors - MLCC; Supplier Part Number 1: C576711; Tolerance: ±5%; Voltage Rating: 16V; Temperature Coefficient: X7R; RoHS: Yes; ComponentLink1Description: Datasheet; ComponentLink1URL: https://wmsc.lcsc.com/wmsc/upload/file/pdf/v2/lcsc/2204271615_YAGEO-CC0402JRX7R7BB563_C576711.pdf; ComponentLink2Description: JLCPCB Part URL; ComponentLink2URL: https://jlcpcb.com/partdetail/C576711; ComponentLink3Description: LCSC Part URL; ComponentLink3URL: https://lcsc.com/product-detail/Multilayer-Ceramic-Capacitors-MLCC---SMD-SMT_YAGEO-YAGEO-CC0402JRX7R7BB563_C576711.html
footprint CAP-0402 (0402 (1005M) Capacitor)
pins: 1, 2

## CC0402JRX7R7BB682
designator C?  Capacitance: 6.8nF  (hidden comment: *)
Capacitor, Ceramic (MLCC), 6.8nF, ±5%, 16V, X7R, ±5%, SMD 0402; Manufacturer: YAGEO; Manufacturer Part Number: CC0402JRX7R7BB682; Package Size: 0402; JLCPCB Basic Part: No; JLCPCB Part Number: C527003; Supplier 1: LCSC; Category: Capacitors - MLCC; Supplier Part Number 1: C527003; Tolerance: ±5%; Voltage Rating: 16V; Temperature Coefficient: X7R; RoHS: Yes; ComponentLink1Description: Datasheet; ComponentLink1URL: https://wmsc.lcsc.com/wmsc/upload/file/pdf/v2/lcsc/2006031835_YAGEO-CC0402JRX7R7BB682_C527003.pdf; ComponentLink2Description: JLCPCB Part URL; ComponentLink2URL: https://jlcpcb.com/partdetail/C527003; ComponentLink3Description: LCSC Part URL; ComponentLink3URL: https://lcsc.com/product-detail/Multilayer-Ceramic-Capacitors-MLCC---SMD-SMT_YAGEO-YAGEO-CC0402JRX7R7BB682_C527003.html
footprint CAP-0402 (0402 (1005M) Capacitor)
pins: 1, 2

## CC0402JRX7R7BB822
designator C?  Capacitance: 8.2nF  (hidden comment: *)
Capacitor, Ceramic (MLCC), 8.2nF, ±5%, 16V, X7R, ±5%, SMD 0402; Manufacturer: YAGEO; Manufacturer Part Number: CC0402JRX7R7BB822; Package Size: 0402; JLCPCB Basic Part: No; JLCPCB Part Number: C541449; Supplier 1: LCSC; Category: Capacitors - MLCC; Supplier Part Number 1: C541449; Tolerance: ±5%; Voltage Rating: 16V; Temperature Coefficient: X7R; RoHS: Yes; ComponentLink1Description: Datasheet; ComponentLink1URL: https://wmsc.lcsc.com/wmsc/upload/file/pdf/v2/lcsc/2006151136_YAGEO-CC0402JRX7R7BB822_C541449.pdf; ComponentLink2Description: JLCPCB Part URL; ComponentLink2URL: https://jlcpcb.com/partdetail/C541449; ComponentLink3Description: LCSC Part URL; ComponentLink3URL: https://lcsc.com/product-detail/Multilayer-Ceramic-Capacitors-MLCC---SMD-SMT_YAGEO-YAGEO-CC0402JRX7R7BB822_C541449.html
footprint CAP-0402 (0402 (1005M) Capacitor)
pins: 1, 2

## CC0402JRX7R8BB102
designator C?  Capacitance: 1nF  (hidden comment: *)
Capacitor, Ceramic (MLCC), 1nF, ±5%, 25V, X7R, ±5%, SMD 0402; Manufacturer: YAGEO; Manufacturer Part Number: CC0402JRX7R8BB102; Package Size: 0402; JLCPCB Basic Part: No; JLCPCB Part Number: C541442; Supplier 1: LCSC; Category: Capacitors - MLCC; Supplier Part Number 1: C541442; Tolerance: ±5%; Voltage Rating: 25V; Temperature Coefficient: X7R; RoHS: Yes; ComponentLink1Description: Datasheet; ComponentLink1URL: https://wmsc.lcsc.com/wmsc/upload/file/pdf/v2/lcsc/2006151136_YAGEO-CC0402JRX7R8BB102_C541442.pdf; ComponentLink2Description: JLCPCB Part URL; ComponentLink2URL: https://jlcpcb.com/partdetail/C541442; ComponentLink3Description: LCSC Part URL; ComponentLink3URL: https://lcsc.com/product-detail/Multilayer-Ceramic-Capacitors-MLCC---SMD-SMT_YAGEO-YAGEO-CC0402JRX7R8BB102_C541442.html
footprint CAP-0402 (0402 (1005M) Capacitor)
pins: 1, 2

## CC0402JRX7R8BB103
designator C?  Capacitance: 10nF  (hidden comment: *)
Capacitor, Ceramic (MLCC), 10nF, ±5%, 25V, X7R, ±5%, SMD 0402; Manufacturer: YAGEO; Manufacturer Part Number: CC0402JRX7R8BB103; Package Size: 0402; JLCPCB Basic Part: No; JLCPCB Part Number: C541443; Supplier 1: LCSC; Category: Capacitors - MLCC; Supplier Part Number 1: C541443; Tolerance: ±5%; Voltage Rating: 25V; Temperature Coefficient: X7R; RoHS: Yes; ComponentLink1Description: Datasheet; ComponentLink1URL: https://wmsc.lcsc.com/wmsc/upload/file/pdf/v2/lcsc/2006151136_YAGEO-CC0402JRX7R8BB103_C541443.pdf; ComponentLink2Description: JLCPCB Part URL; ComponentLink2URL: https://jlcpcb.com/partdetail/C541443; ComponentLink3Description: LCSC Part URL; ComponentLink3URL: https://lcsc.com/product-detail/Multilayer-Ceramic-Capacitors-MLCC---SMD-SMT_YAGEO-YAGEO-CC0402JRX7R8BB103_C541443.html
footprint CAP-0402 (0402 (1005M) Capacitor)
pins: 1, 2

## CC0402JRX7R8BB104
designator C?  Capacitance: 100nF  (hidden comment: *)
Capacitor, Ceramic (MLCC), 100nF, ±5%, 25V, X7R, ±5%, SMD 0402; Manufacturer: YAGEO; Manufacturer Part Number: CC0402JRX7R8BB104; Package Size: 0402; JLCPCB Basic Part: No; JLCPCB Part Number: C541465; Supplier 1: LCSC; Category: Capacitors - MLCC; Supplier Part Number 1: C541465; Tolerance: ±5%; Voltage Rating: 25V; Temperature Coefficient: X7R; RoHS: Yes; ComponentLink1Description: Datasheet; ComponentLink1URL: https://wmsc.lcsc.com/wmsc/upload/file/pdf/v2/lcsc/2006151139_YAGEO-CC0402JRX7R8BB104_C541465.pdf; ComponentLink2Description: JLCPCB Part URL; ComponentLink2URL: https://jlcpcb.com/partdetail/C541465; ComponentLink3Description: LCSC Part URL; ComponentLink3URL: https://lcsc.com/product-detail/Multilayer-Ceramic-Capacitors-MLCC---SMD-SMT_YAGEO-YAGEO-CC0402JRX7R8BB104_C541465.html
footprint CAP-0402 (0402 (1005M) Capacitor)
pins: 1, 2

## CC0402JRX7R8BB332
designator C?  Capacitance: 3.3nF  (hidden comment: *)
Capacitor, Ceramic (MLCC), 3.3nF, ±5%, 25V, X7R, ±5%, SMD 0402; Manufacturer: YAGEO; Manufacturer Part Number: CC0402JRX7R8BB332; Package Size: 0402; JLCPCB Basic Part: No; JLCPCB Part Number: C527004; Supplier 1: LCSC; Category: Capacitors - MLCC; Supplier Part Number 1: C527004; Tolerance: ±5%; Voltage Rating: 25V; Temperature Coefficient: X7R; RoHS: Yes; ComponentLink1Description: Datasheet; ComponentLink1URL: https://wmsc.lcsc.com/wmsc/upload/file/pdf/v2/lcsc/2005262134_YAGEO-CC0402JRX7R8BB332_C527004.pdf; ComponentLink2Description: JLCPCB Part URL; ComponentLink2URL: https://jlcpcb.com/partdetail/C527004; ComponentLink3Description: LCSC Part URL; ComponentLink3URL: https://lcsc.com/product-detail/Multilayer-Ceramic-Capacitors-MLCC---SMD-SMT_YAGEO-YAGEO-CC0402JRX7R8BB332_C527004.html
footprint CAP-0402 (0402 (1005M) Capacitor)
pins: 1, 2

## CC0402JRX7R8BB333
designator C?  Capacitance: 33nF  (hidden comment: *)
Capacitor, Ceramic (MLCC), 33nF, ±5%, 25V, X7R, ±5%, SMD 0402; Manufacturer: YAGEO; Manufacturer Part Number: CC0402JRX7R8BB333; Package Size: 0402; JLCPCB Basic Part: No; JLCPCB Part Number: C541462; Supplier 1: LCSC; Category: Capacitors - MLCC; Supplier Part Number 1: C541462; Tolerance: ±5%; Voltage Rating: 25V; Temperature Coefficient: X7R; RoHS: Yes; ComponentLink1Description: Datasheet; ComponentLink1URL: https://wmsc.lcsc.com/wmsc/upload/file/pdf/v2/lcsc/2006151138_YAGEO-CC0402JRX7R8BB333_C541462.pdf; ComponentLink2Description: JLCPCB Part URL; ComponentLink2URL: https://jlcpcb.com/partdetail/C541462; ComponentLink3Description: LCSC Part URL; ComponentLink3URL: https://lcsc.com/product-detail/Multilayer-Ceramic-Capacitors-MLCC---SMD-SMT_YAGEO-YAGEO-CC0402JRX7R8BB333_C541462.html
footprint CAP-0402 (0402 (1005M) Capacitor)
pins: 1, 2

## CC0402JRX7R8BB392
designator C?  Capacitance: 3.9nF  (hidden comment: *)
Capacitor, Ceramic (MLCC), 3.9nF, ±5%, 25V, X7R, ±5%, SMD 0402; Manufacturer: YAGEO; Manufacturer Part Number: CC0402JRX7R8BB392; Package Size: 0402; JLCPCB Basic Part: No; JLCPCB Part Number: C541450; Supplier 1: LCSC; Category: Capacitors - MLCC; Supplier Part Number 1: C541450; Tolerance: ±5%; Voltage Rating: 25V; Temperature Coefficient: X7R; RoHS: Yes; ComponentLink1Description: Datasheet; ComponentLink1URL: https://wmsc.lcsc.com/wmsc/upload/file/pdf/v2/lcsc/2006151137_YAGEO-CC0402JRX7R8BB392_C541450.pdf; ComponentLink2Description: JLCPCB Part URL; ComponentLink2URL: https://jlcpcb.com/partdetail/C541450; ComponentLink3Description: LCSC Part URL; ComponentLink3URL: https://lcsc.com/product-detail/Multilayer-Ceramic-Capacitors-MLCC---SMD-SMT_YAGEO-YAGEO-CC0402JRX7R8BB392_C541450.html
footprint CAP-0402 (0402 (1005M) Capacitor)
pins: 1, 2

## CC0402JRX7R8BB472
designator C?  Capacitance: 4.7nF  (hidden comment: *)
Capacitor, Ceramic (MLCC), 4.7nF, ±5%, 25V, X7R, ±5%, SMD 0402; Manufacturer: YAGEO; Manufacturer Part Number: CC0402JRX7R8BB472; Package Size: 0402; JLCPCB Basic Part: No; JLCPCB Part Number: C527005; Supplier 1: LCSC; Category: Capacitors - MLCC; Supplier Part Number 1: C527005; Tolerance: ±5%; Voltage Rating: 25V; Temperature Coefficient: X7R; RoHS: Yes; ComponentLink1Description: Datasheet; ComponentLink1URL: https://wmsc.lcsc.com/wmsc/upload/file/pdf/v2/lcsc/2006031835_YAGEO-CC0402JRX7R8BB472_C527005.pdf; ComponentLink2Description: JLCPCB Part URL; ComponentLink2URL: https://jlcpcb.com/partdetail/C527005; ComponentLink3Description: LCSC Part URL; ComponentLink3URL: https://lcsc.com/product-detail/Multilayer-Ceramic-Capacitors-MLCC---SMD-SMT_YAGEO-YAGEO-CC0402JRX7R8BB472_C527005.html
footprint CAP-0402 (0402 (1005M) Capacitor)
pins: 1, 2

## CC0402JRX7R8BB682
designator C?  Capacitance: 6.8nF  (hidden comment: *)
Capacitor, Ceramic (MLCC), 6.8nF, ±5%, 25V, X7R, ±5%, SMD 0402; Manufacturer: YAGEO; Manufacturer Part Number: CC0402JRX7R8BB682; Package Size: 0402; JLCPCB Basic Part: No; JLCPCB Part Number: C1852845; Supplier 1: LCSC; Category: Capacitors - MLCC; Supplier Part Number 1: C1852845; Tolerance: ±5%; Voltage Rating: 25V; Temperature Coefficient: X7R; RoHS: Yes; ComponentLink1Description: Datasheet; ComponentLink1URL: https://wmsc.lcsc.com/wmsc/upload/file/pdf/v2/lcsc/2201271000_YAGEO-CC0402JRX7R8BB682_C1852845.pdf; ComponentLink2Description: JLCPCB Part URL; ComponentLink2URL: https://jlcpcb.com/partdetail/C1852845; ComponentLink3Description: LCSC Part URL; ComponentLink3URL: https://lcsc.com/product-detail/Multilayer-Ceramic-Capacitors-MLCC---SMD-SMT_YAGEO-YAGEO-CC0402JRX7R8BB682_C1852845.html
footprint CAP-0402 (0402 (1005M) Capacitor)
pins: 1, 2

## CC0402JRX7R8BB822
designator C?  Capacitance: 8.2nF  (hidden comment: *)
Capacitor, Ceramic (MLCC), 8.2nF, ±5%, 25V, X7R, ±5%, SMD 0402; Manufacturer: YAGEO; Manufacturer Part Number: CC0402JRX7R8BB822; Package Size: 0402; JLCPCB Basic Part: No; JLCPCB Part Number: C527006; Supplier 1: LCSC; Category: Capacitors - MLCC; Supplier Part Number 1: C527006; Tolerance: ±5%; Voltage Rating: 25V; Temperature Coefficient: X7R; RoHS: Yes; ComponentLink1Description: Datasheet; ComponentLink1URL: https://wmsc.lcsc.com/wmsc/upload/file/pdf/v2/lcsc/2005222139_YAGEO-CC0402JRX7R8BB822_C527006.pdf; ComponentLink2Description: JLCPCB Part URL; ComponentLink2URL: https://jlcpcb.com/partdetail/C527006; ComponentLink3Description: LCSC Part URL; ComponentLink3URL: https://lcsc.com/product-detail/Multilayer-Ceramic-Capacitors-MLCC---SMD-SMT_YAGEO-YAGEO-CC0402JRX7R8BB822_C527006.html
footprint CAP-0402 (0402 (1005M) Capacitor)
pins: 1, 2

## CC0402JRX7R9BB101
designator C?  Capacitance: 100pF  (hidden comment: *)
Capacitor, Ceramic (MLCC), 100pF, ±5%, 50V, X7R, ±5%, SMD 0402; Manufacturer: YAGEO; Manufacturer Part Number: CC0402JRX7R9BB101; Package Size: 0402; JLCPCB Basic Part: No; JLCPCB Part Number: C281750; Supplier 1: LCSC; Category: Capacitors - MLCC; Supplier Part Number 1: C281750; Tolerance: ±5%; Voltage Rating: 50V; Temperature Coefficient: X7R; RoHS: Yes; ComponentLink1Description: Datasheet; ComponentLink1URL: https://wmsc.lcsc.com/wmsc/upload/file/pdf/v2/lcsc/2311211121_YAGEO-CC0402JRX7R9BB101_C281750.pdf; ComponentLink2Description: JLCPCB Part URL; ComponentLink2URL: https://jlcpcb.com/partdetail/C281750; ComponentLink3Description: LCSC Part URL; ComponentLink3URL: https://lcsc.com/product-detail/Multilayer-Ceramic-Capacitors-MLCC---SMD-SMT_YAGEO-YAGEO-CC0402JRX7R9BB101_C281750.html
footprint CAP-0402 (0402 (1005M) Capacitor)
pins: 1, 2

## CC0402JRX7R9BB102
designator C?  Capacitance: 1nF  (hidden comment: *)
Capacitor, Ceramic (MLCC), 1nF, ±5%, 50V, X7R, ±5%, SMD 0402; Manufacturer: YAGEO; Manufacturer Part Number: CC0402JRX7R9BB102; Package Size: 0402; JLCPCB Basic Part: No; JLCPCB Part Number: C93920; Supplier 1: LCSC; Category: Capacitors - MLCC; Supplier Part Number 1: C93920; Tolerance: ±5%; Voltage Rating: 50V; Temperature Coefficient: X7R; RoHS: Yes; ComponentLink1Description: Datasheet; ComponentLink1URL: https://wmsc.lcsc.com/wmsc/upload/file/pdf/v2/lcsc/2304140030_YAGEO-CC0402JRX7R9BB102_C93920.pdf; ComponentLink2Description: JLCPCB Part URL; ComponentLink2URL: https://jlcpcb.com/partdetail/C93920; ComponentLink3Description: LCSC Part URL; ComponentLink3URL: https://lcsc.com/product-detail/Multilayer-Ceramic-Capacitors-MLCC---SMD-SMT_YAGEO-YAGEO-CC0402JRX7R9BB102_C93920.html
footprint CAP-0402 (0402 (1005M) Capacitor)
pins: 1, 2

## CC0402JRX7R9BB103
designator C?  Capacitance: 10nF  (hidden comment: *)
Capacitor, Ceramic (MLCC), 10nF, ±5%, 50V, X7R, ±5%, SMD 0402; Manufacturer: YAGEO; Manufacturer Part Number: CC0402JRX7R9BB103; Package Size: 0402; JLCPCB Basic Part: No; JLCPCB Part Number: C272878; Supplier 1: LCSC; Category: Capacitors - MLCC; Supplier Part Number 1: C272878; Tolerance: ±5%; Voltage Rating: 50V; Temperature Coefficient: X7R; RoHS: Yes; ComponentLink1Description: Datasheet; ComponentLink1URL: https://wmsc.lcsc.com/wmsc/upload/file/pdf/v2/lcsc/2304140030_YAGEO-CC0402JRX7R9BB103_C272878.pdf; ComponentLink2Description: JLCPCB Part URL; ComponentLink2URL: https://jlcpcb.com/partdetail/C272878; ComponentLink3Description: LCSC Part URL; ComponentLink3URL: https://lcsc.com/product-detail/Multilayer-Ceramic-Capacitors-MLCC---SMD-SMT_YAGEO-YAGEO-CC0402JRX7R9BB103_C272878.html
footprint CAP-0402 (0402 (1005M) Capacitor)
pins: 1, 2

## CC0402JRX7R9BB104
designator C?  Capacitance: 100nF  (hidden comment: *)
Capacitor, Ceramic (MLCC), 100nF, ±5%, 50V, X7R, ±5%, SMD 0402; Manufacturer: YAGEO; Manufacturer Part Number: CC0402JRX7R9BB104; Package Size: 0402; JLCPCB Basic Part: No; JLCPCB Part Number: C5182432; Supplier 1: LCSC; Category: Capacitors - MLCC; Supplier Part Number 1: C5182432; Tolerance: ±5%; Voltage Rating: 50V; Temperature Coefficient: X7R; RoHS: Yes; ComponentLink1Description: Datasheet; ComponentLink1URL: https://wmsc.lcsc.com/wmsc/upload/file/pdf/v2/lcsc/2311211121_YAGEO-CC0402JRX7R9BB104_C5182432.pdf; ComponentLink2Description: JLCPCB Part URL; ComponentLink2URL: https://jlcpcb.com/partdetail/C5182432; ComponentLink3Description: LCSC Part URL; ComponentLink3URL: https://lcsc.com/product-detail/Multilayer-Ceramic-Capacitors-MLCC---SMD-SMT_YAGEO-YAGEO-CC0402JRX7R9BB104_C5182432.html
footprint CAP-0402 (0402 (1005M) Capacitor)
pins: 1, 2

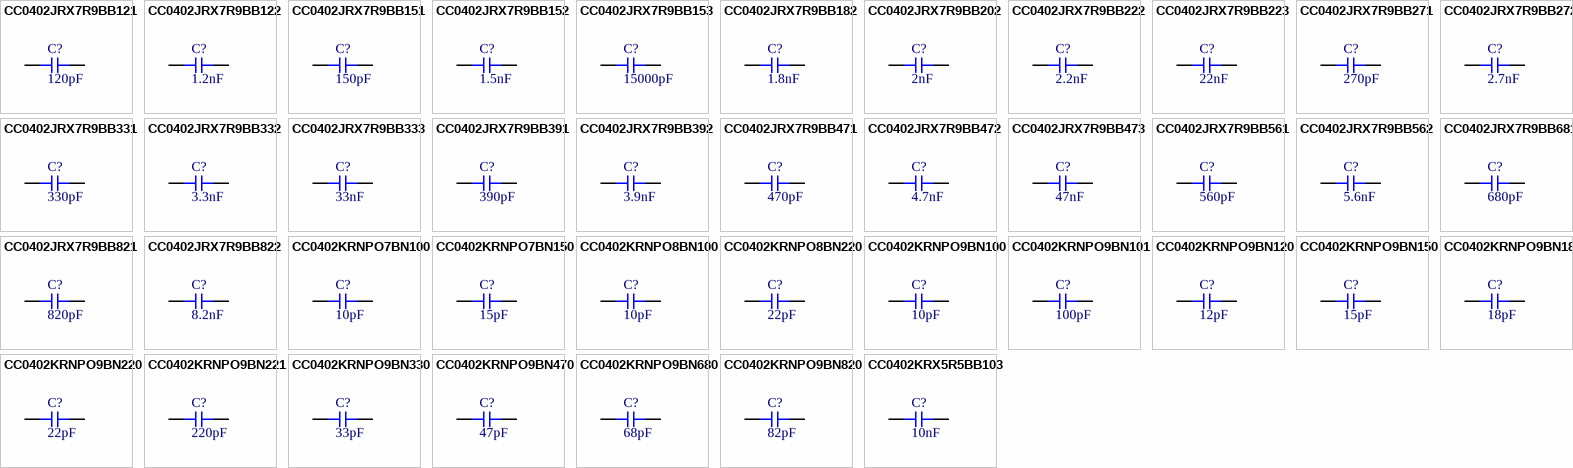
[diagram p36: symbols CC0402JRX7R9BB121 to CC0402KRX5R5BB103]

## CC0402JRX7R9BB121
designator C?  Capacitance: 120pF  (hidden comment: *)
Capacitor, Ceramic (MLCC), 120pF, ±5%, 50V, X7R, ±5%, SMD 0402; Manufacturer: YAGEO; Manufacturer Part Number: CC0402JRX7R9BB121; Package Size: 0402; JLCPCB Basic Part: No; JLCPCB Part Number: C541451; Supplier 1: LCSC; Category: Capacitors - MLCC; Supplier Part Number 1: C541451; Tolerance: ±5%; Voltage Rating: 50V; Temperature Coefficient: X7R; RoHS: Yes; ComponentLink1Description: Datasheet; ComponentLink1URL: https://wmsc.lcsc.com/wmsc/upload/file/pdf/v2/lcsc/2006151137_YAGEO-CC0402JRX7R9BB121_C541451.pdf; ComponentLink2Description: JLCPCB Part URL; ComponentLink2URL: https://jlcpcb.com/partdetail/C541451; ComponentLink3Description: LCSC Part URL; ComponentLink3URL: https://lcsc.com/product-detail/Multilayer-Ceramic-Capacitors-MLCC---SMD-SMT_YAGEO-YAGEO-CC0402JRX7R9BB121_C541451.html
footprint CAP-0402 (0402 (1005M) Capacitor)
pins: 1, 2

## CC0402JRX7R9BB122
designator C?  Capacitance: 1.2nF  (hidden comment: *)
Capacitor, Ceramic (MLCC), 1.2nF, ±5%, 50V, X7R, ±5%, SMD 0402; Manufacturer: YAGEO; Manufacturer Part Number: CC0402JRX7R9BB122; Package Size: 0402; JLCPCB Basic Part: No; JLCPCB Part Number: C541452; Supplier 1: LCSC; Category: Capacitors - MLCC; Supplier Part Number 1: C541452; Tolerance: ±5%; Voltage Rating: 50V; Temperature Coefficient: X7R; RoHS: Yes; ComponentLink1Description: Datasheet; ComponentLink1URL: https://wmsc.lcsc.com/wmsc/upload/file/pdf/v2/lcsc/2006151137_YAGEO-CC0402JRX7R9BB122_C541452.pdf; ComponentLink2Description: JLCPCB Part URL; ComponentLink2URL: https://jlcpcb.com/partdetail/C541452; ComponentLink3Description: LCSC Part URL; ComponentLink3URL: https://lcsc.com/product-detail/Multilayer-Ceramic-Capacitors-MLCC---SMD-SMT_YAGEO-YAGEO-CC0402JRX7R9BB122_C541452.html
footprint CAP-0402 (0402 (1005M) Capacitor)
pins: 1, 2
